# Altium schematic symbol library LTSpiceLibrary.SchLib: 776 symbols (part 3 of 3)
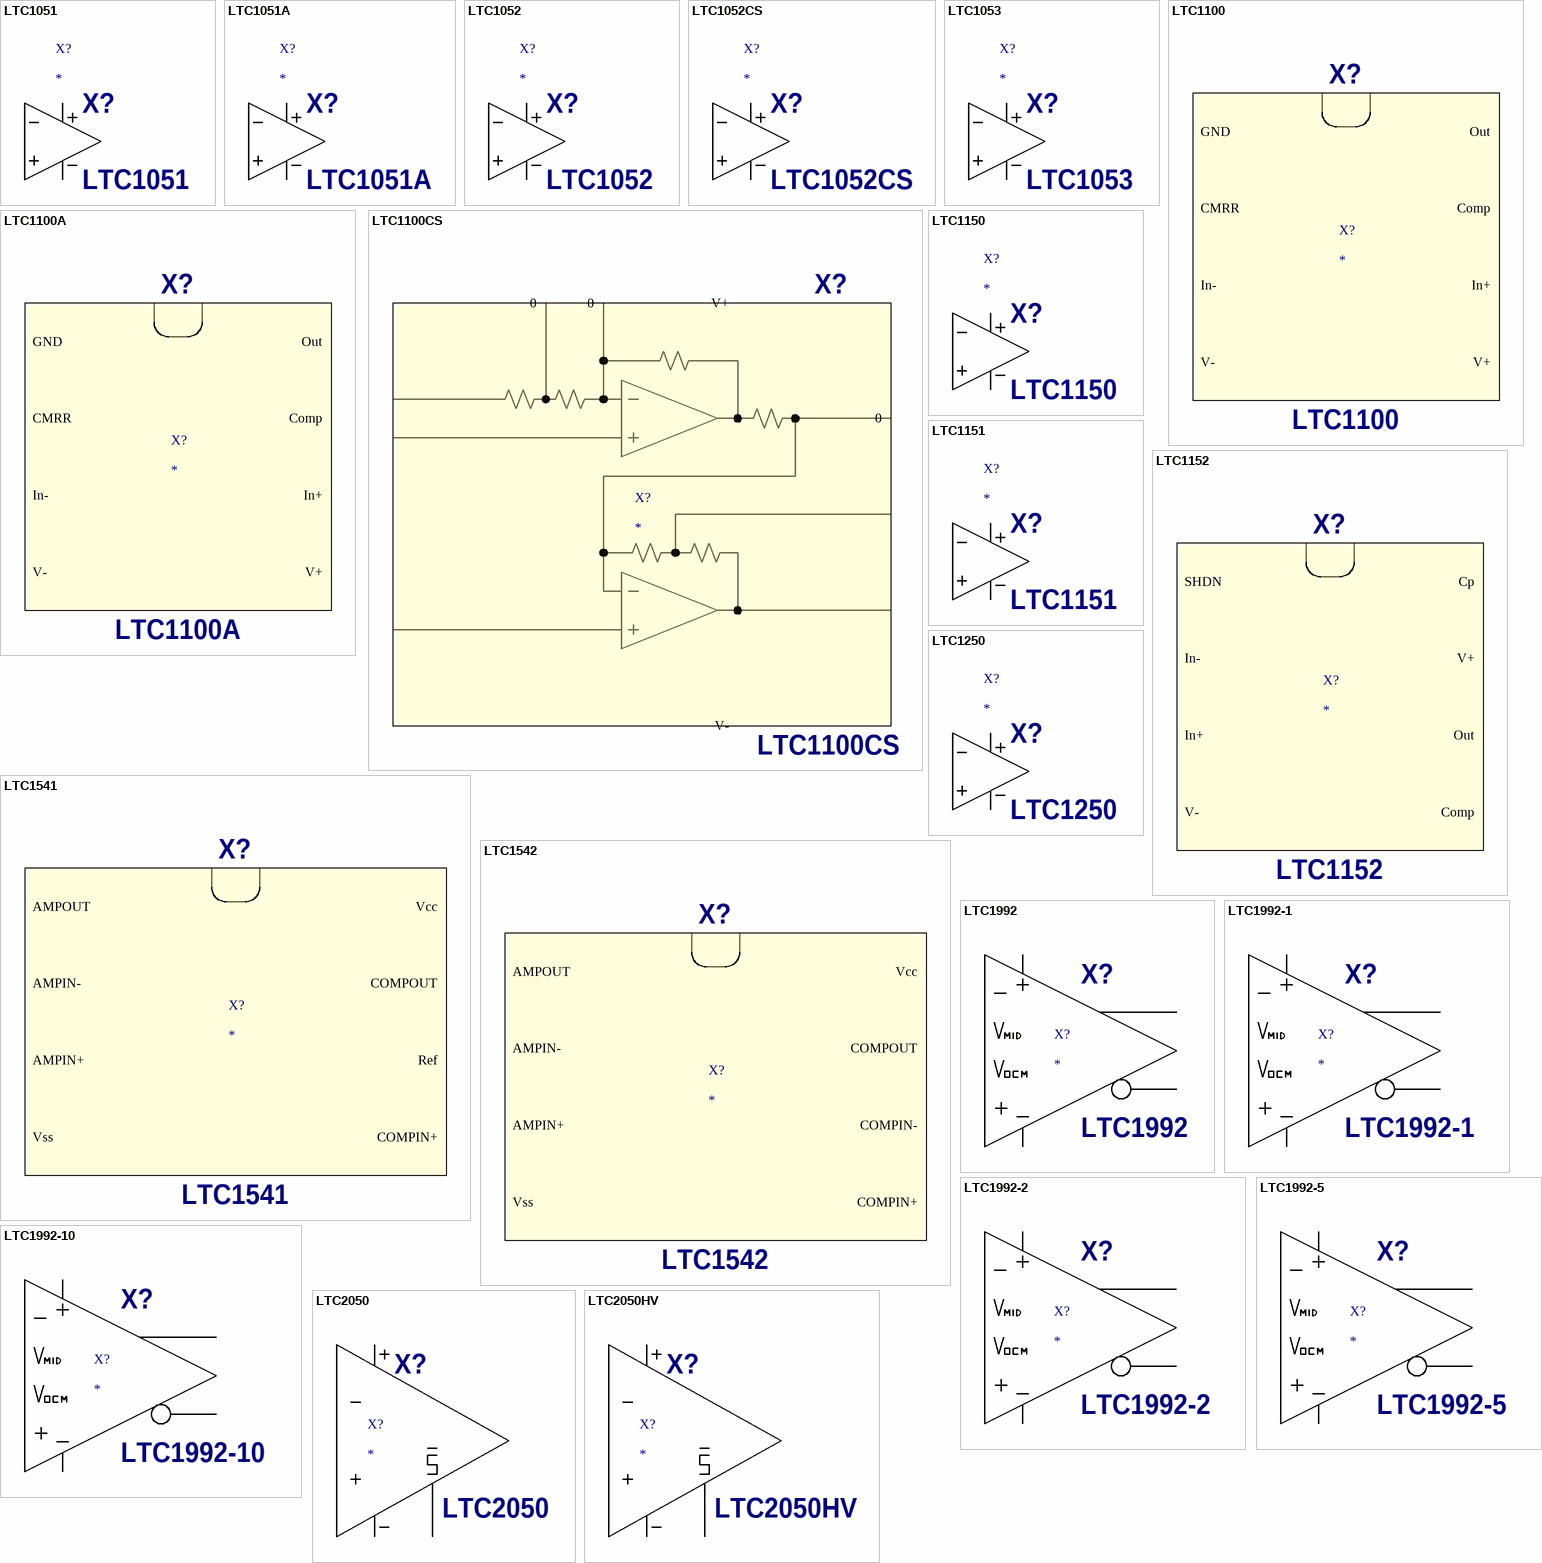
[diagram p30: symbols LTC1051 to LTC2050HV]

## LTC1542
designator X?  value LTC1542  InstName: X?
Prefix: X; Description: �Power Operational Amplifier and Comparator; SpiceModel: LTC.lib; Value2: LTC1542
pins: 1 AMPOUT, 2 AMPIN-, 3 AMPIN+, 4 Vss, 5 COMPIN+, 6 COMPIN-, 7 COMPOUT, 8 Vcc

## LTC1992
designator X?  value LTC1992  InstName: X?
Prefix: X; Description: Low Power, Fully Differential I/O Amplifier; SpiceModel: LTC4.LIB; Value2: LTC1992
pins: 1 IN-, 2 VOCM, 3 V+, 4 OUT+, 5 OUT-, 6 V-, 7 VMID, 8 IN+

## LTC1992-1
designator X?  value LTC1992-1  InstName: X?
Prefix: X; Description: Low Power, Fully Differential I/O Amplifier; SpiceModel: LTC4.LIB; Value2: LTC1992-1
pins: 1 IN-, 2 VOCM, 3 V+, 4 OUT+, 5 OUT-, 6 V-, 7 VMID, 8 IN+

## LTC1992-2
designator X?  value LTC1992-2  InstName: X?
Prefix: X; Description: Low Power, Fully Differential I/O Amplifier; SpiceModel: LTC4.LIB; Value2: LTC1992-2
pins: 1 IN-, 2 VOCM, 3 V+, 4 OUT+, 5 OUT-, 6 V-, 7 VMID, 8 IN+

## LTC1992-5
designator X?  value LTC1992-5  InstName: X?
Prefix: X; Description: Low Power, Fully Differential I/O Amplifier; SpiceModel: LTC4.LIB; Value2: LTC1992-5
pins: 1 IN-, 2 VOCM, 3 V+, 4 OUT+, 5 OUT-, 6 V-, 7 VMID, 8 IN+

## LTC1992-10
designator X?  value LTC1992-10  InstName: X?
Prefix: X; Description: Low Power, Fully Differential I/O Amplifier; SpiceModel: LTC4.LIB; Value2: LTC1992-10
pins: 1 IN-, 2 VOCM, 3 V+, 4 OUT+, 5 OUT-, 6 V-, 7 VMID, 8 IN+

## LTC2050
designator X?  value LTC2050  InstName: X?
Prefix: X; Description: Low Noise, Zero-Drift Operational Amplifier in SOT-23; SpiceModel: LTC.lib; Value2: LTC2050
pins: 1 In+, 2 In-, 3 V+, 4 V-, 5 OUT, 6 SHDN

## LTC2050HV
designator X?  value LTC2050HV  InstName: X?
Prefix: X; Value2: LTC2050; Description: Low Noise, Zero-Drift Operational Amplifier in SOT-23; SpiceModel: LTC.lib
pins: 1 In+, 2 In-, 3 V+, 4 V-, 5 OUT, 6 SHDN

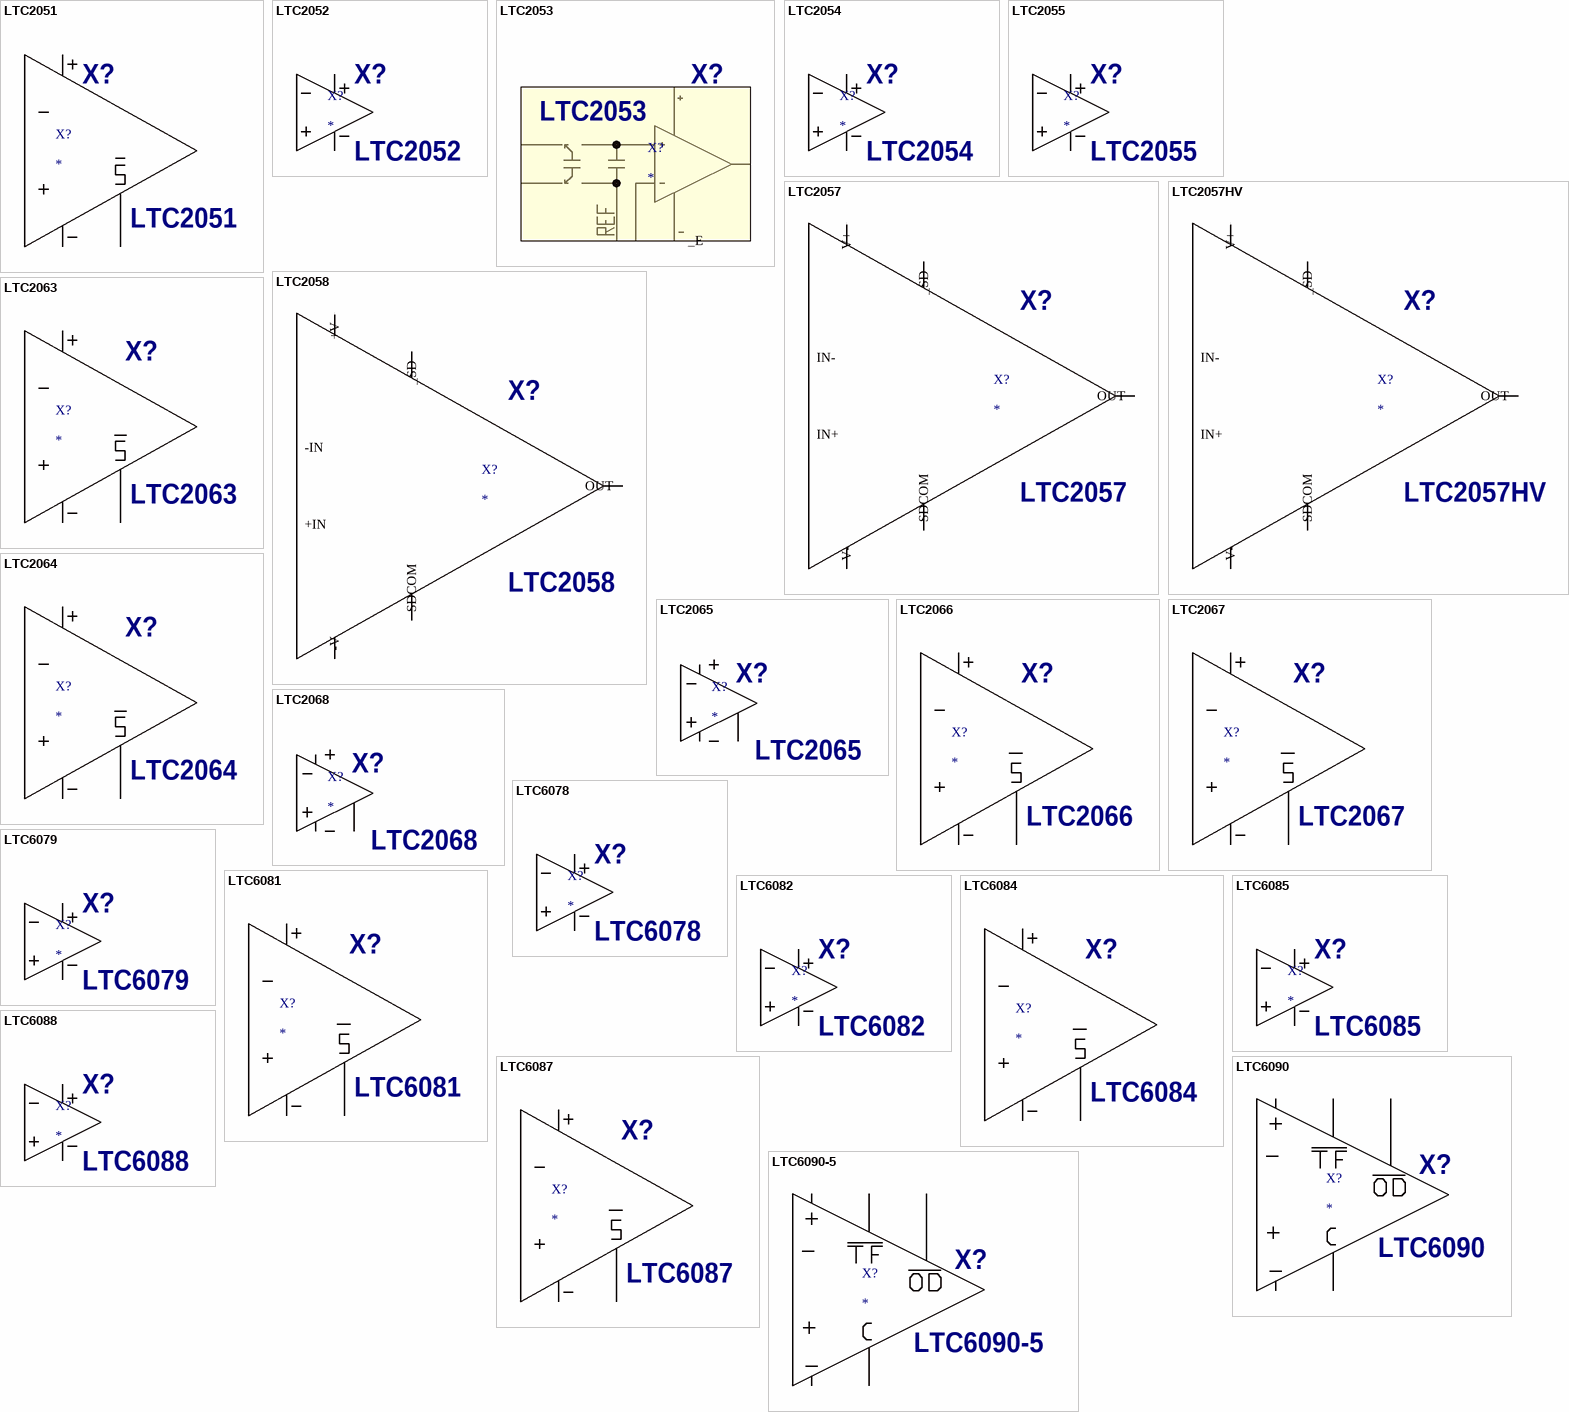
[diagram p19: symbols LTC2051 to LTC6090-5]

## LTC2051
designator X?  value LTC2051  InstName: X?
Prefix: X; Value2: LTC2050; Description: Low Noise, Zero-Drift Operational Amplifier in SOT-23; SpiceModel: LTC.lib
pins: 1 In+, 2 In-, 3 V+, 4 V-, 5 OUT, 6 SHDN

## LTC2052
designator X?  value LTC2052  InstName: X?
Prefix: X; Description: Quad Zero-Drift Op Amp; SpiceModel: LTC2.LIB; Value2: LTC2052
pins: 1 IN+, 2 IN-, 3 OUT, 4 VCC, 5 VEE

## LTC2053
designator X?  value LTC2053  InstName: X?
Prefix: X; Description: Precision, Rail-to-Rail, Zero-Drift Instrumentation Amplifier with Resistor-Programmable Gain; SpiceModel: LTC4.lib; Value2: LTC2053
pins: 1 _E, 2 -IN, 3 +IN, 4 V-, 5 REF, 6 RG, 7 OUT, 8 V+

## LTC2054
designator X?  value LTC2054  InstName: X?
Prefix: X; Description: Low Power Zero-Drift Op Amp in SOT-23; SpiceModel: LTC2.LIB; Value2: LTC2054
pins: 1 IN+, 2 IN-, 3 OUT, 4 VCC, 5 VEE

## LTC2055
designator X?  value LTC2055  InstName: X?
Prefix: X; Value2: LTC2054; Description: Dual Low Power Zero-Drift Op Amp in SOT-23; SpiceModel: LTC2.LIB
pins: 1 IN+, 2 IN-, 3 OUT, 4 VCC, 5 VEE

## LTC2057
designator X?  value LTC2057  InstName: X?
Prefix: X; Description: High Voltage, Low Noise Zero-Drift Operation Amplifier; SpiceModel: LTC6.lib; Value2: LTC2057
pins: 1 _SD, 2 IN-, 3 IN+, 4 V-, 5 OUT, 6 V+, 7 SDCOM

## LTC2057HV
designator X?  value LTC2057HV  InstName: X?
Prefix: X; Value2: LTC2057; Description: High Voltage, Low Noise Zero-Drift Operation Amplifier; SpiceModel: LTC6.lib
pins: 1 _SD, 2 IN-, 3 IN+, 4 V-, 5 OUT, 6 V+, 7 SDCOM

## LTC2058
designator X?  value LTC2058  InstName: X?
Prefix: X; Description: Dual 36V, Low Noise Zero-Drift Operational Amplifier; SpiceModel: LTC2.lib; Value2: LTC2058
pins: 1 _SD, 2 -IN, 3 +IN, 4 -V, 5 OUT, 6 +V, 7 SDCOM

## LTC2063
designator X?  value LTC2063  InstName: X?
Prefix: X; Description: 2�A Supply Current, Low Ib, Zero-Drift Operational Amplifier; SpiceModel: LTC3.lib; Value2: LTC2063
pins: 1 IN+, 2 IN-, 3 OUT, 4 VCC, 5 VEE, 6 SHDN_L

## LTC2064
designator X?  value LTC2064  InstName: X?
Prefix: X; Value2: LTC2063; Description: Dual 2�A Supply Current, Low Ib, Zero-Drift Operational Amplifier; SpiceModel: LTC3.lib
pins: 1 IN+, 2 IN-, 3 OUT, 4 VCC, 5 VEE, 6 SHDN_L

## LTC2065
designator X?  value LTC2065  InstName: X?
Prefix: X; Value2: LTC2063; Description: Quad 2�A Supply Current, Low Ib, Zero-Drift Operational Amplifier; SpiceModel: LTC3.lib
pins: 1 IN+, 2 IN-, 3 OUT, 4 VCC, 5 VEE, 6 SHDN_L

## LTC2066
designator X?  value LTC2066  InstName: X?
Prefix: X; Description: 10�A Supply Current, Low IB, Zero-Drift Operational Amplifier; SpiceModel: LTC5.lib; Value2: LTC2066
pins: 1 IN+, 2 IN-, 3 VCC, 4 VEE, 5 OUT, 6 SHDN

## LTC2067
designator X?  value LTC2067  InstName: X?
Prefix: X; Value2: LTC2066; Description: Dual 10�A Supply Current, Low IB, Zero-Drift Operational Amplifier; SpiceModel: LTC5.lib
pins: 1 IN+, 2 IN-, 3 VCC, 4 VEE, 5 OUT, 6 SHDN

## LTC2068
designator X?  value LTC2068  InstName: X?
Prefix: X; Value2: LTC2066; Description: Quad 10�A Supply Current, Low IB, Zero-Drift Operational Amplifier; SpiceModel: LTC5.lib
pins: 1 IN+, 2 IN-, 3 VCC, 4 VEE, 5 OUT, 6 SHDN

## LTC6078
designator X?  value LTC6078  InstName: X?
Prefix: X; Description: Dual �Power Precision, CMOS Rail-to-Rail Amplifier; SpiceModel: LTC5.lib; Value2: LTC6078
pins: 1 IN+, 2 IN-, 3 VCC, 4 VEE, 5 OUT

## LTC6079
designator X?  value LTC6079  InstName: X?
Prefix: X; Value2: LTC6078; Description: Quad �Power Precision, CMOS Rail-to-Rail Amplifier; SpiceModel: LTC5.lib
pins: 1 IN+, 2 IN-, 3 VCC, 4 VEE, 5 OUT

## LTC6081
designator X?  value LTC6081  InstName: X?
Prefix: X; Description: Dual �Power Precision, CMOS Rail-to-Rail Operational Amplifier; SpiceModel: LTC6.lib; Value2: LTC6081
pins: 1 IN+, 2 IN-, 3 VCC, 4 VEE, 5 OUT, 6 SHDN

## LTC6082
designator X?  value LTC6082  InstName: X?
Prefix: X; Description: Quad �Power Precision, CMOS Rail-to-Rail Operational Amplifier; SpiceModel: LTC6.lib; Value2: LTC6082
pins: 1 IN+, 2 IN-, 3 VCC, 4 VEE, 5 OUT

## LTC6084
designator X?  value LTC6084  InstName: X?
Prefix: X; Description: Dual 1.5MHz, Rail-to-Rail, CMOS Operational Amplifier; SpiceModel: LTC6.lib; Value2: LTC6084
pins: 1 IN+, 2 IN-, 3 VCC, 4 VEE, 5 OUT, 6 SHDN

## LTC6085
designator X?  value LTC6085  InstName: X?
Prefix: X; Description: Quad 1.5MHz, Rail-to-Rail, CMOS Operational Amplifier; SpiceModel: LTC6.lib; Value2: LTC6085
pins: 1 IN+, 2 IN-, 3 VCC, 4 VEE, 5 OUT

## LTC6087
designator X?  value LTC6087  InstName: X?
Prefix: X; Description: Dual 14MHz, Rail-to-Rail, CMOS Amplifiers; SpiceModel: LTC7.lib; Value2: LTC6087
pins: 1 IN+, 2 IN-, 3 VCC, 4 VEE, 5 OUT, 6 SHDN

## LTC6088
designator X?  value LTC6088  InstName: X?
Prefix: X; Description: QUAD 14MHz, Rail-to-Rail, CMOS Amplifiers; SpiceModel: LTC7.lib; Value2: LTC6088
pins: 1 3, 2, 3 7, 4, 5 1

## LTC6090
designator X?  value LTC6090  InstName: X?
Prefix: X; Description: 140V CMOS Rail-to-Rail Output, Picoamp Input Current Op Amp; SpiceModel: LTC5.lib; Value2: LTC6090
pins: 1 COM, 2 IN-, 3 IN+, 4 V-, 5 _TF, 6 OUT, 7 V+, 8 _OD

## LTC6090-5
designator X?  value LTC6090-5  InstName: X?
Prefix: X; Description: 140V CMOS Rail-to-Rail Output, Picoamp Input Current Op Amp Gain>=5; SpiceModel: LTC5.lib; Value2: LTC6090-5
pins: 1 COM, 2 IN-, 3 IN+, 4 V-, 5 _TF, 6 OUT, 7 V+, 8 _OD

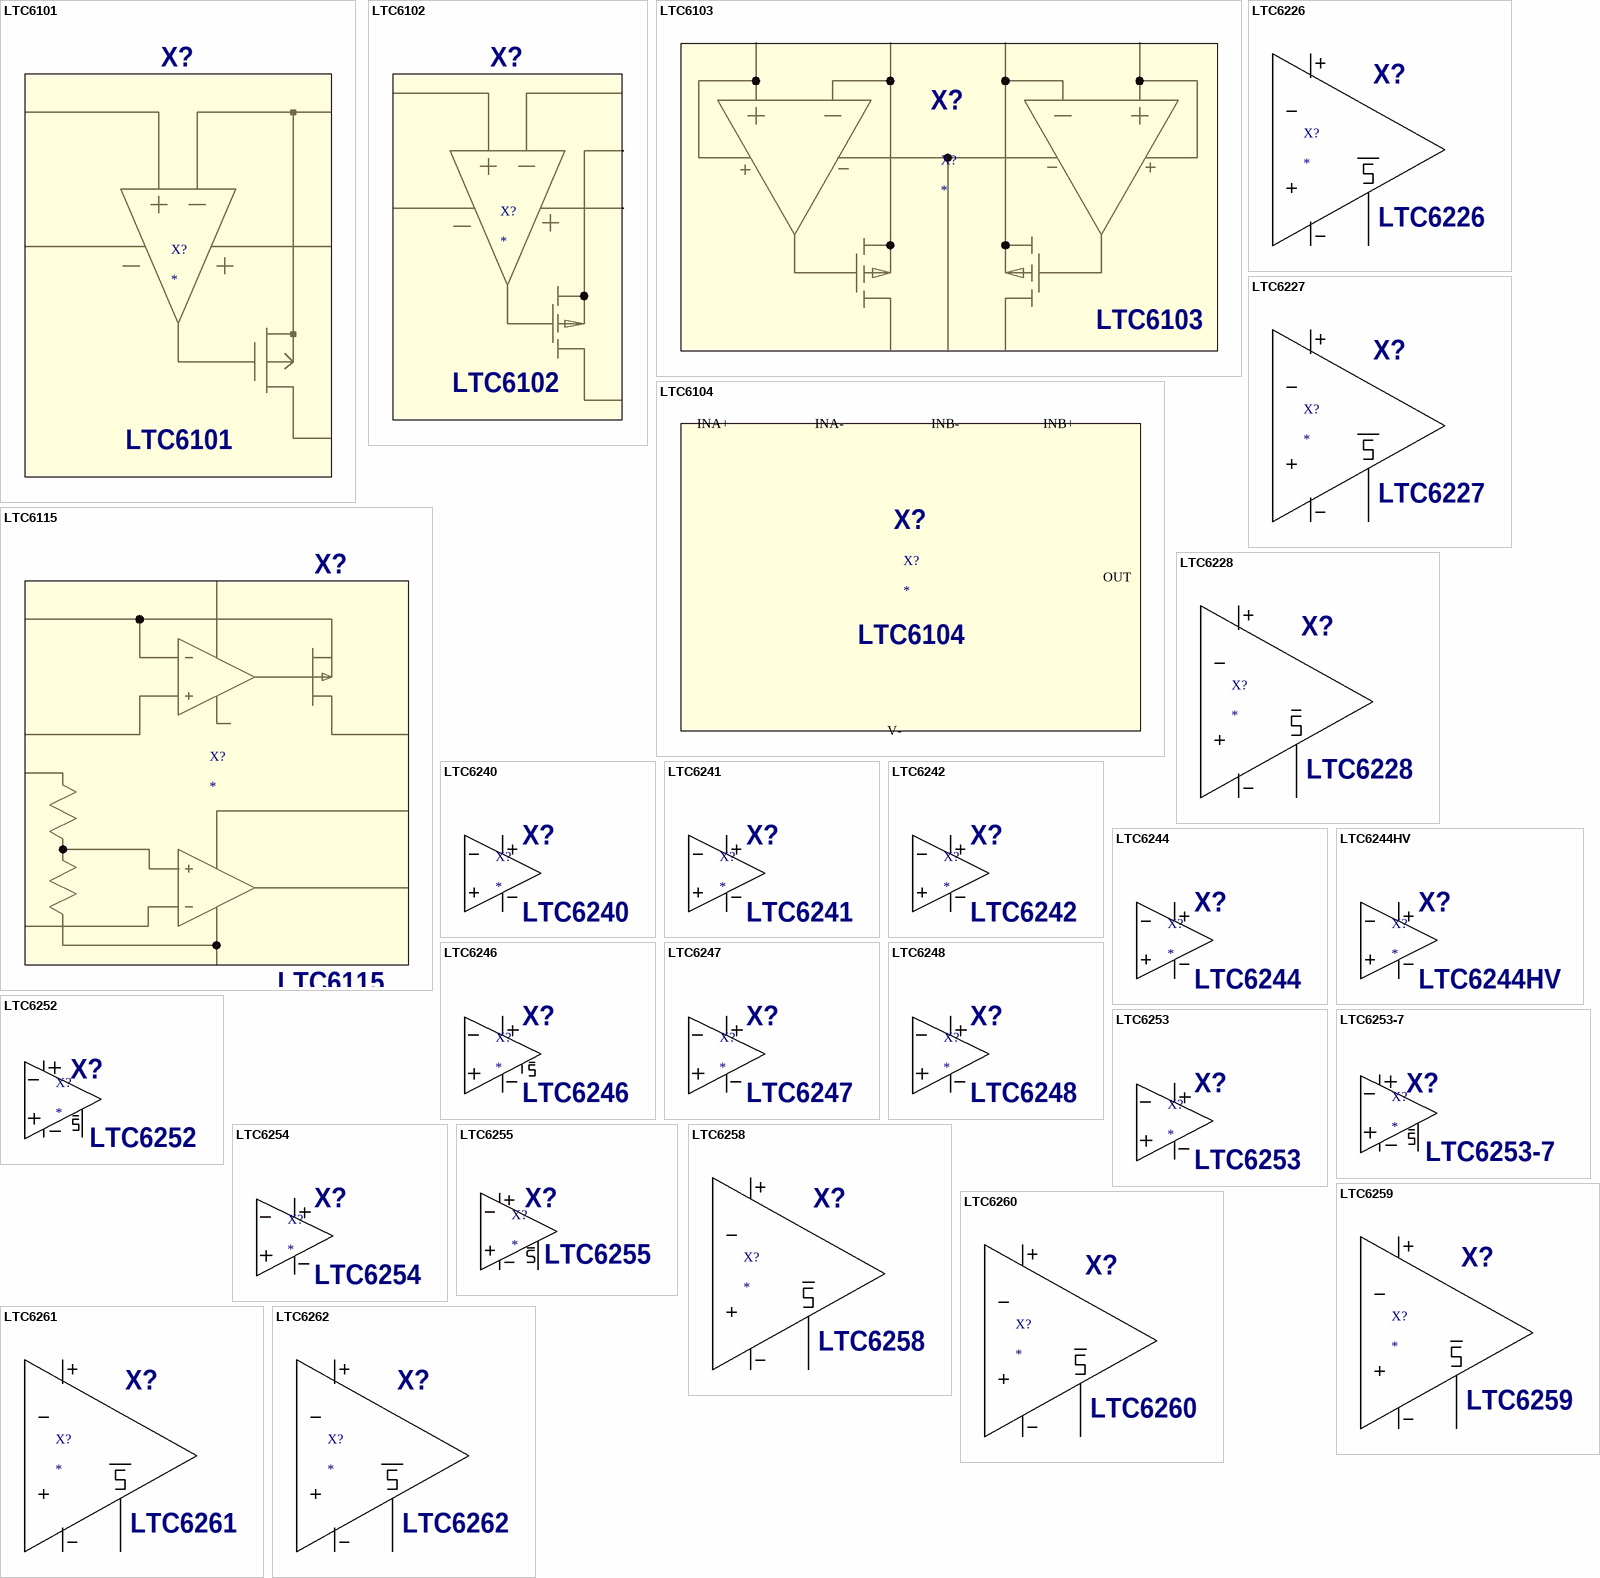
[diagram p20: symbols LTC6101 to LTC6262]

## LTC6101
designator X?  value LTC6101  InstName: X?
Prefix: X; Description: High Voltage, High-Side Current Sense in SOT-23; SpiceModel: LTC3.lib; Value2: LTC6101
pins: 1 OUT, 2 VEE, 3 IN-, 4 IN+, 5 VCC

## LTC6102
designator X?  value LTC6102  InstName: X?
Prefix: X; Description: Precision Zero Drift Current Sense Amplifier; SpiceModel: LTC6.lib; Value2: LTC6102
pins: 1 OUT, 2 VEE, 3 -INS, 4 IN+, 5 VCC, 6 -INF

## LTC6103
designator X?  value LTC6103  InstName: X?
Prefix: X; Description: Dual High Voltage, High-Side Current Sense in SOT-23; SpiceModel: LTC6.lib; Value2: LTC6103
pins: 1 OUTA, 2 OUTB, 3 V-, 4 +INB, 5 -INB, 6 -INA, 7 +INA

## LTC6104
designator X?  value LTC6104  InstName: X?
Prefix: X; Description: High Voltage, High Side, Bi-Directional Current Sense Amplifier; SpiceModel: LTC4.lib; Value2: LTC6104
pins: 1 OUT, 2 V-, 3 INB+, 4 INB-, 5 INA-, 6 INA+

## LTC6115
designator X?  value LTC6115  InstName: X?
Prefix: X; Description: High Voltage High Side Current and Voltage Sense; SpiceModel: LTC5.lib; Value2: LTC6115
pins: 1 -IN, 2 OUTI, 3 GND, 4 FB, 5 OUTV, 6 VS, 7 VIN, 8 +V, 9 +IN

## LTC6226
designator X?  value LTC6226  InstName: X?
Prefix: X; Description: 1nV/rHz 420 MHz, 180V/us, Low Distortion Rail-to-Rail Output Op Amp; SpiceModel: LTC6226.sub; Value2: LTC6226
pins: 1 IN+, 2 IN-, 3 OUT, 4 VCC, 5 VEE, 6 SHDN_L

## LTC6227
designator X?  value LTC6227  InstName: X?
Prefix: X; Value2: LTC6226; Description: 1nV/rHz 420 MHz, 180V/us, Low Distortion Rail-to-Rail Output Op Amp; SpiceModel: LTC6226.sub
pins: 1 IN+, 2 IN-, 3 OUT, 4 VCC, 5 VEE, 6 SHDN_L

## LTC6228
designator X?  value LTC6228  InstName: X?
Prefix: X; Description: 0.88nV/rHz 730 MHz, 500V/us, Low Distortion Rail-to-Rail Output Op Amp with Shutdown; SpiceModel: LTC6228.lib; Value2: LTC6228
pins: 1 IN+, 2 IN-, 3 OUT, 4 VCC, 5 VEE, 6 SHDN_L

## LTC6240
designator X?  value LTC6240  InstName: X?
Prefix: X; Value2: LTC6241; Description: 18MHz Low Noise, Rail-to-Rail, CMOS Op Amp; SpiceModel: LTC4.lib
pins: 1 IN+, 2 IN-, 3 VCC, 4 VEE, 5 OUT

## LTC6241
designator X?  value LTC6241  InstName: X?
Prefix: X; Description: Dual 18MHz Low Noise, Rail-to-Rail, CMOS Op Amp; SpiceModel: LTC4.lib; Value2: LTC6241
pins: 1 IN+, 2 IN-, 3 VCC, 4 VEE, 5 OUT

## LTC6242
designator X?  value LTC6242  InstName: X?
Prefix: X; Value2: LTC6241; Description: Quad 18MHz Low Noise, Rail-to-Rail, CMOS Op Amp; SpiceModel: LTC4.lib
pins: 1 IN+, 2 IN-, 3 VCC, 4 VEE, 5 OUT

## LTC6244
designator X?  value LTC6244  InstName: X?
Prefix: X; Description: 50MHz Low Noise, Rail-to-Rail, CMOS Op Amp; SpiceModel: LTC5.lib; Value2: LTC6244
pins: 1 IN+, 2 IN-, 3 VCC, 4 VEE, 5 OUT

## LTC6244HV
designator X?  value LTC6244HV  InstName: X?
Prefix: X; Description: 50MHz Low Noise, Rail-to-Rail, CMOS Op Amp; SpiceModel: LTC5.lib; Value2: LTC6244HV
pins: 1 IN+, 2 IN-, 3 VCC, 4 VEE, 5 OUT

## LTC6246
designator X?  value LTC6246  InstName: X?
Prefix: X; Description: 180MHz, 1mA, R_R I/O Op Amp; SpiceModel: LTC7.lib; Value2: LTC6246
pins: 1, 2 4, 3, 4 2, 5 9, 6 7

## LTC6247
designator X?  value LTC6247  InstName: X?
Prefix: X; Description: Dual, 180MHz, 1mA, R-R I/O Op Amp; SpiceModel: LTC7.lib; Value2: LTC6247
pins: 1, 2 4, 3, 4 2, 5 7

## LTC6248
designator X?  value LTC6248  InstName: X?
Prefix: X; Value2: LTC6247; Description: Quad, 180MHz, 1mA, R-R I/O Op Amp; SpiceModel: LTC7.lib
pins: 1, 2 4, 3, 4 2, 5 7

## LTC6252
designator X?  value LTC6252  InstName: X?
Prefix: X; Description: 720MHz, 3.5mA, R_R I/O Op Amp; SpiceModel: LTC4.lib; Value2: LTC6252
pins: 1, 2, 3, 4, 5, 6

## LTC6253
designator X?  value LTC6253  InstName: X?
Prefix: X; Description: Dual, 720MHz, 3.5mA, R-R I/O Op Amp; SpiceModel: LTC4.lib; Value2: LTC6253
pins: 1, 2, 3, 4, 5

## LTC6253-7
designator X?  value LTC6253-7  InstName: X?
Prefix: X; Description: 2GHz, 3.5mA Gain of 7 Stable Rail-to-Rail I/O Dual Op Amp; SpiceModel: LTC4.lib; Value2: LTC6253-7
pins: 1, 2, 3, 4, 5, 6

## LTC6254
designator X?  value LTC6254  InstName: X?
Prefix: X; Value2: LTC6253; Description: Quad, 720MHz, 3.5mA, R-R I/O Op Amp; SpiceModel: LTC4.lib
pins: 1, 2, 3, 4, 5

## LTC6255
designator X?  value LTC6255  InstName: X?
Prefix: X; Description: 6.5MHz, 65�A Power Efficient Rail-to-Rail I/O Op Amp; SpiceModel: LTC4.lib; Value2: LTC6255
pins: 1 In+, 2 In-, 3 V+, 4 V-, 5 OUT, 6 SHDN

## LTC6258
designator X?  value LTC6258  InstName: X?
Prefix: X; Description: 1.3MHz, 20�A Power Efficient Rail-to-Rail I/O Op Amp; SpiceModel: LTC3.lib; Value2: LTC6258
pins: 1 IN+, 2 IN-, 3 OUT, 4 VCC, 5 VEE, 6 SHDN_L

## LTC6259
designator X?  value LTC6259  InstName: X?
Prefix: X; Value2: LTC6258; Description: Dual 1.3MHz, 20�A Power Efficient Rail-to-Rail I/O Op Amp; SpiceModel: LTC3.lib
pins: 1 IN+, 2 IN-, 3 OUT, 4 VCC, 5 VEE, 6 SHDN_L

## LTC6260
designator X?  value LTC6260  InstName: X?
Prefix: X; Value2: LTC6258; Description: Quad 1.3MHz, 20�A Power Efficient Rail-to-Rail I/O Op Amp; SpiceModel: LTC3.lib
pins: 1 IN+, 2 IN-, 3 OUT, 4 VCC, 5 VEE, 6 SHDN_L

## LTC6261
designator X?  value LTC6261  InstName: X?
Prefix: X; Description: 30MHz, 240�A Power Efficient Rail-to-Rail I/O Op Amp; SpiceModel: LTC6.lib; Value2: LTC6261
pins: 1 IN+, 2 IN-, 3 OUT, 4 VCC, 5 VEE, 6 SHDN_L

## LTC6262
designator X?  value LTC6262  InstName: X?
Prefix: X; Value2: LTC6261; Description: Dual 30MHz, 240�A Power Efficient Rail-to-Rail I/O Op Amp; SpiceModel: LTC6.lib
pins: 1 IN+, 2 IN-, 3 OUT, 4 VCC, 5 VEE, 6 SHDN_L

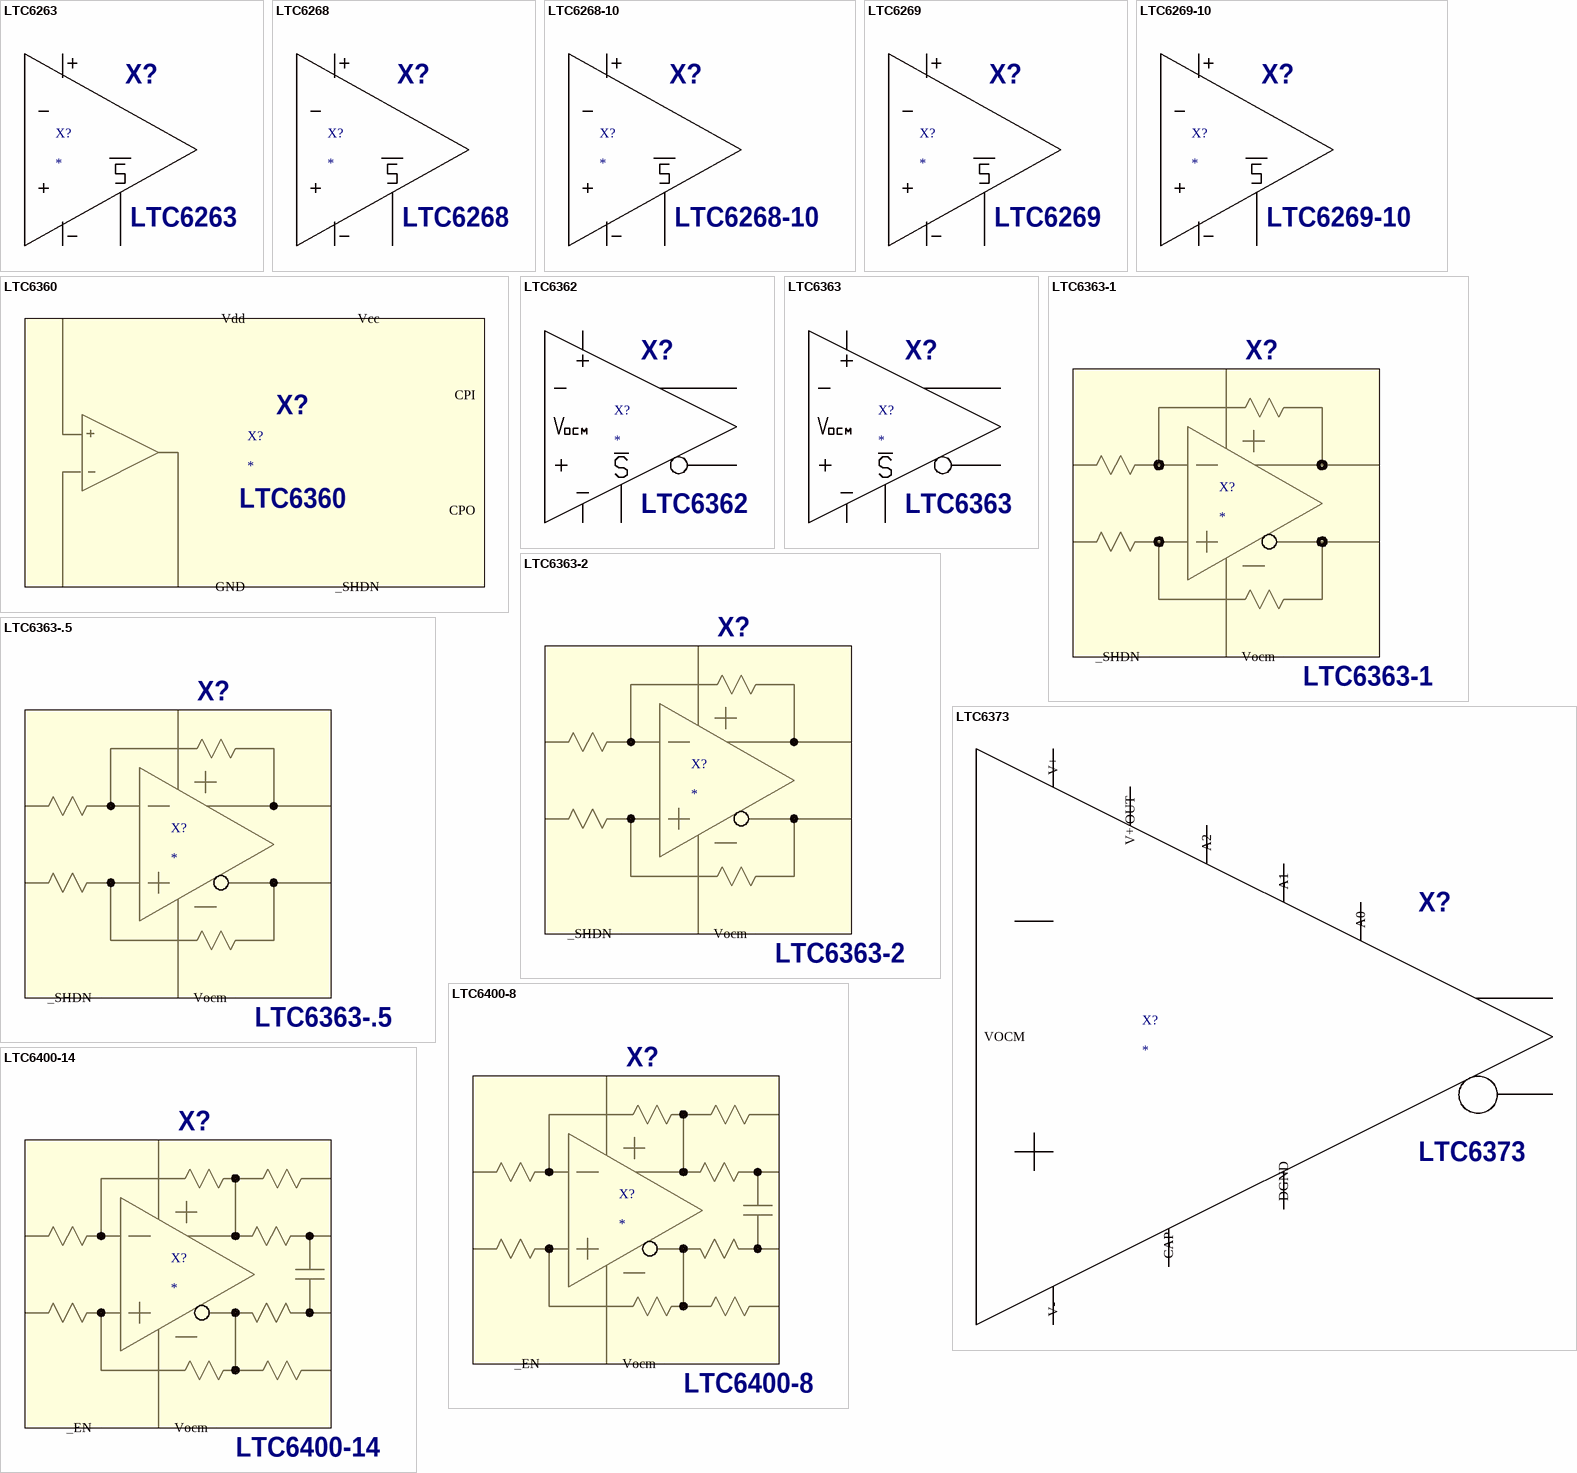
[diagram p21: symbols LTC6263 to LTC6400-14]

## LTC6263
designator X?  value LTC6263  InstName: X?
Prefix: X; Value2: LTC6261; Description: Quad 30MHz, 240�A Power Efficient Rail-to-Rail I/O Op Amp; SpiceModel: LTC6.lib
pins: 1 IN+, 2 IN-, 3 OUT, 4 VCC, 5 VEE, 6 SHDN_L

## LTC6268
designator X?  value LTC6268  InstName: X?
Prefix: X; Description: 500 MHz Ultra-Low Bias Current FET Input Op Amp; SpiceModel: LTC2.lib; Value2: LTC6268
pins: 1 IN+, 2 IN-, 3 OUT, 4 VCC, 5 VEE, 6 SHDN_L

## LTC6268-10
designator X?  value LTC6268-10  InstName: X?
Prefix: X; Description: 4GHz Ultra-Low Bias Current FET Input Op Amp; SpiceModel: LTC2.lib; Value2: LTC6268-10
pins: 1 IN+, 2 IN-, 3 OUT, 4 VCC, 5 VEE, 6 SHDN_L

## LTC6269
designator X?  value LTC6269  InstName: X?
Prefix: X; Value2: LTC6268; Description: 500 MHz Ultra-Low Bias Current FET Input Op Amp; SpiceModel: LTC2.lib
pins: 1 IN+, 2 IN-, 3 OUT, 4 VCC, 5 VEE, 6 SHDN_L

## LTC6269-10
designator X?  value LTC6269-10  InstName: X?
Prefix: X; Value2: LTC6268-10; Description: 4GHz Ultra-Low Bias Current FET Input Op Amp; SpiceModel: LTC2.lib
pins: 1 IN+, 2 IN-, 3 OUT, 4 VCC, 5 VEE, 6 SHDN_L

## LTC6360
designator X?  value LTC6360  InstName: X?
Prefix: X; Description: Very Low Noise Single-Ended SAR ADC Driver with True Zero Output; SpiceModel: LTC6360.sub; Value2: LTC6360
pins: 1 -IN, 2 OUT, 3 Vcc, 4 Vdd, 5 CPO, 6 CPI, 7 _SHDN, 8 +IN, 9 GND

## LTC6362
designator X?  value LTC6362  InstName: X?
Prefix: X; Description: Precision Low Power Rail-to-Rail Input/Output Differential Op Amp/SAR ADC Driver; SpiceModel: LTC7.lib; Value2: LTC6362
pins: 1 IN-, 2 VOCM, 3 V+, 4 OUT+, 5 OUT-, 6 V-, 7 SHDN, 8 IN+

## LTC6363
designator X?  value LTC6363  InstName: X?
Prefix: X; Description: Precision, Low Power Rail-to-Rail Output Differential Op Amp; SpiceModel: LTC2.lib; Value2: LTC6363
pins: 1 IN-, 2 VOCM, 3 V+, 4 OUT+, 5 OUT-, 6 V-, 7 SHDN, 8 IN+

## LTC6363-1
designator X?  value LTC6363-1  InstName: X?
Prefix: X; Description: Precision, Low Power Differential Amplifier; SpiceModel: LTC2.lib; Value2: LTC6363-1
pins: 1 IN-, 2 Vocm, 3 V+, 4 +OUT, 5 -OUT, 6 V-, 7 _SHDN, 8 IN+

## LTC6363-2
designator X?  value LTC6363-2  InstName: X?
Prefix: X; Description: Precision, Low Power Differential Amplifier; SpiceModel: LTC2.lib; Value2: LTC6363-2
pins: 1 IN-, 2 Vocm, 3 V+, 4 +OUT, 5 -OUT, 6 V-, 7 _SHDN, 8 IN+

## LTC6363-.5
designator X?  value LTC6363-.5  InstName: X?
Prefix: X; Description: Precision, Low Power Differential Amplifier; SpiceModel: LTC2.lib; Value2: LTC6363-.5
pins: 1 IN-, 2 Vocm, 3 V+, 4 +OUT, 5 -OUT, 6 V-, 7 _SHDN, 8 IN+

## LTC6373
designator X?  value LTC6373  InstName: X?
Prefix: X; Description: 36V Fully Differential Programmable-Gain Instrumentation Amplifier with 20pA Input Bias Current; SpiceModel: LTC6373.lib; Value2: LTC6373
pins: 1 -IN, 2 A0, 3 A1, 4 V+, 5 V+ OUT, 6 +OUT, 7 -OUT, 8 VOCM, 9 CAP, 10 DGND, 11 A2, 12 +IN, 13 V-

## LTC6400-8
designator X?  value LTC6400-8  InstName: X?
Prefix: X; Description: 2.2GHz Low Noise, Low Distortion Differential ADC Driver for DC-300MHz\n\nNote: Distortion is not modeled.; SpiceModel: LTC6.lib; Value2: LTC6400-8
pins: 1 IN-, 2 Vocm, 3 V+, 4 OUT+, 5 OUT-, 6 V-, 7 _EN, 8 IN+, 9 OUTF-, 10 OUTF+

## LTC6400-14
designator X?  value LTC6400-14  InstName: X?
Prefix: X; Description: 2.4GHz Low Noise, Low Distortion Differential ADC Driver for 300MHz IF\n\nNote: Distortion is not modeled.; SpiceModel: LTC6.lib; Value2: LTC6400-14
pins: 1 IN-, 2 Vocm, 3 V+, 4 OUT+, 5 OUT-, 6 V-, 7 _EN, 8 IN+, 9 OUTF-, 10 OUTF+

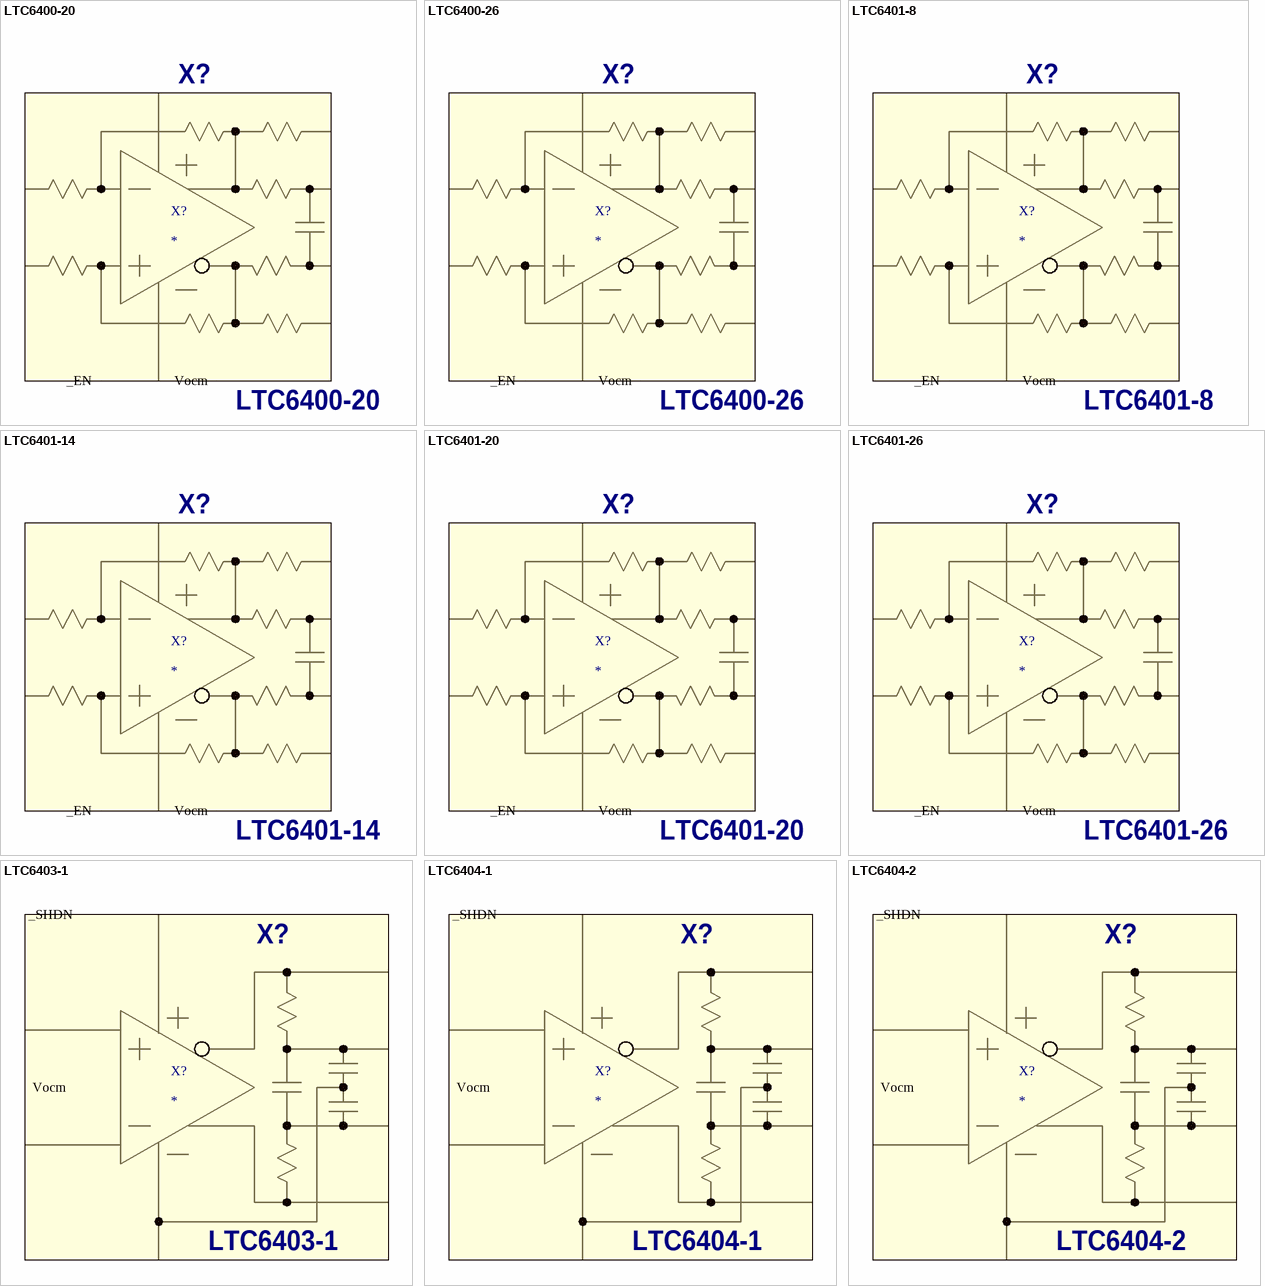
[diagram p22: symbols LTC6400-20 to LTC6404-2]

## LTC6400-20
designator X?  value LTC6400-20  InstName: X?
Prefix: X; Description: 1.8GHz Low Noise, Low Distortion Differential ADC Driver for 300MHz IF\n\nNote: Distortion is not modeled.; SpiceModel: LTC6.lib; Value2: LTC6400-20
pins: 1 IN-, 2 Vocm, 3 V+, 4 OUT+, 5 OUT-, 6 V-, 7 _EN, 8 IN+, 9 OUTF-, 10 OUTF+

## LTC6400-26
designator X?  value LTC6400-26  InstName: X?
Prefix: X; Description: 1.9GHz Low Noise, Low Distortion Differential ADC Driver for DC-300MHz\n\nNote: Distortion is not modeled.; SpiceModel: LTC6.lib; Value2: LTC6400-26
pins: 1 IN-, 2 Vocm, 3 V+, 4 OUT+, 5 OUT-, 6 V-, 7 _EN, 8 IN+, 9 OUTF-, 10 OUTF+

## LTC6401-8
designator X?  value LTC6401-8  InstName: X?
Prefix: X; Description: 2.2GHz Low Noise, Low Distortion Differential ADC Driver for DC-140MHz IF\n\nNote: Distortion is not modeled.; SpiceModel: LTC6.lib; Value2: LTC6401-8
pins: 1 IN-, 2 Vocm, 3 V+, 4 OUT+, 5 OUT-, 6 V-, 7 _EN, 8 IN+, 9 OUTF-, 10 OUTF+

## LTC6401-14
designator X?  value LTC6401-14  InstName: X?
Prefix: X; Description: 2GHz Low Noise, Low Distortion Differential ADC Driver for DC-140MHz IF\n\nNote: Distortion is not modeled.; SpiceModel: LTC6.lib; Value2: LTC6401-14
pins: 1 IN-, 2 Vocm, 3 V+, 4 OUT+, 5 OUT-, 6 V-, 7 _EN, 8 IN+, 9 OUTF-, 10 OUTF+

## LTC6401-20
designator X?  value LTC6401-20  InstName: X?
Prefix: X; Description: 1.3GHz Low Noise, Low Distortion Differential ADC Driver for DC-140MHz IF\n\nNote: Distortion is not modeled.; SpiceModel: LTC6.lib; Value2: LTC6401-20
pins: 1 IN-, 2 Vocm, 3 V+, 4 OUT+, 5 OUT-, 6 V-, 7 _EN, 8 IN+, 9 OUTF-, 10 OUTF+

## LTC6401-26
designator X?  value LTC6401-26  InstName: X?
Prefix: X; Description: 1.6GHz Low Noise, Low Distortion Differential ADC Driver for DC-140MHz IF\n\nNote: Distortion is not modeled.; SpiceModel: LTC6.lib; Value2: LTC6401-26
pins: 1 IN-, 2 Vocm, 3 V+, 4 OUT+, 5 OUT-, 6 V-, 7 _EN, 8 IN+, 9 OUTF-, 10 OUTF+

## LTC6403-1
designator X?  value LTC6403-1  InstName: X?
Prefix: X; Description: 200MHz, Low Noise, Low Power Fully Differential Input/Output Amplifier/Driver\n\nNote: Distortion is not modeled.; SpiceModel: LTC7.lib; Value2: LTC6403-1
pins: 1 IN-, 2 Vocm, 3 V+, 4 OUT+, 5 OUT-, 6 V-, 7 _SHDN, 8 IN+, 9 OUTF+, 10 OUTF-

## LTC6404-1
designator X?  value LTC6404-1  InstName: X?
Prefix: X; Description: 600MHz, Low Noise, High Precision Fully Differential Input/Output Amplifier/Driver\n\nNote: Distortion is not modeled.; SpiceModel: LTC7.lib; Value2: LTC6404-1
pins: 1 IN-, 2 Vocm, 3 V+, 4 OUT+, 5 OUT-, 6 V-, 7 _SHDN, 8 IN+, 9 OUTF-, 10 OUTF+

## LTC6404-2
designator X?  value LTC6404-2  InstName: X?
Prefix: X; Description: 600MHz, Low Noise, High Precision Fully Differential Input/Output Amplifier/Driver\n\nNote: Distortion is not modeled.; SpiceModel: LTC7.lib; Value2: LTC6404-2
pins: 1 IN-, 2 Vocm, 3 V+, 4 OUT+, 5 OUT-, 6 V-, 7 _SHDN, 8 IN+, 9 OUTF-, 10 OUTF+

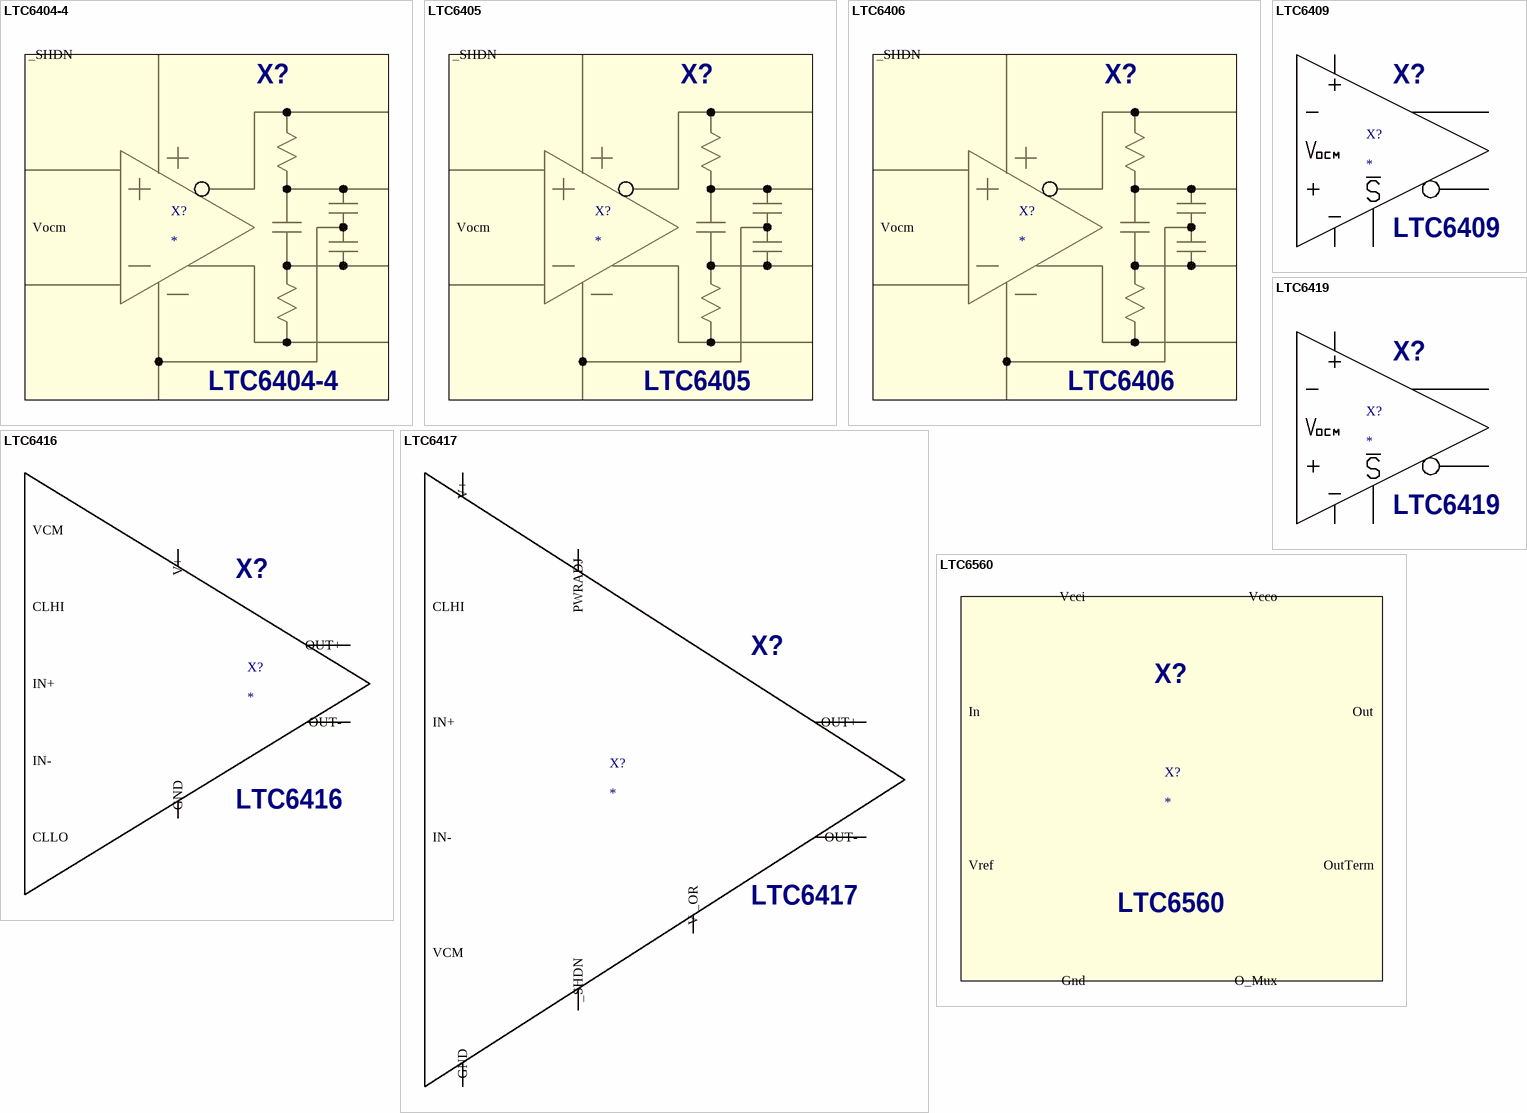
[diagram p23: symbols LTC6404-4 to LTC6560]

## LTC6404-4
designator X?  value LTC6404-4  InstName: X?
Prefix: X; Description: 600MHz, Low Noise, High Precision Fully Differential Input/Output Amplifier/Driver\n\nNote: Distortion is not modeled.; SpiceModel: LTC7.lib; Value2: LTC6404-4
pins: 1 IN-, 2 Vocm, 3 V+, 4 OUT+, 5 OUT-, 6 V-, 7 _SHDN, 8 IN+, 9 OUTF-, 10 OUTF+

## LTC6405
designator X?  value LTC6405  InstName: X?
Prefix: X; Description: 2.7GHz, 5V, Low Noise, Rail-to-Rail Input Differential Input/Output Amplifier/Driver\n\nNote: Distortion is not modeled.; SpiceModel: LTC7.lib; Value2: LTC6405
pins: 1 IN-, 2 Vocm, 3 V+, 4 OUT+, 5 OUT-, 6 V-, 7 _SHDN, 8 IN+, 9 OUTF-, 10 OUTF+

## LTC6406
designator X?  value LTC6406  InstName: X?
Prefix: X; Description: 3GHz, Low Noise, Rail-to-Rail Differential Amplifier/Driver\n\nNote: Distortion is not modeled.; SpiceModel: LTC7.lib; Value2: LTC6406
pins: 1 IN-, 2 Vocm, 3 V+, 4 OUT+, 5 OUT-, 6 V-, 7 _SHDN, 8 IN+, 9 OUTF+, 10 OUTF-

## LTC6409
designator X?  value LTC6409  InstName: X?
Prefix: X; Description: 10GHz GBW, 1.1nV/ Hz� Differential Amplifier/ADC Driver; SpiceModel: LTC6.lib; Value2: LTC6409
pins: 1 OUT-, 2 IN+, 3 SHDN, 4 V+, 5 VOCM, 6 IN-, 7 OUT+, 8 V-

## LTC6416
designator X?  value LTC6416  InstName: X?
Prefix: X; Description: 2GHz Low Noise Differential 16-Bit ADC Buffer; SpiceModel: LTC6.lib; Value2: LTC6416
pins: 1 VCM, 2 CLHI, 3 IN+, 4 IN-, 5 CLLO, 6 GND, 7 OUT-, 8 OUT+, 9 V+

## LTC6417
designator X?  value LTC6417  InstName: X?
Prefix: X; Description: 1.6GHz Low Noise High Linearity Differential Buffer/ 16-Bit ADC Driver with Fast Clamp; SpiceModel: LTC6.lib; Value2: LTC6417
pins: 1 V+, 2 GND, 3 IN+, 4 IN-, 5 OUT+, 6 OUT-, 7 VCM, 8 CLHI, 9 PWRADJ, 10 _SHDN, 11 V _OR
